# Altium footprint library Intelliclone.PcbLib: 372 footprints (part 15 of 24)
Each footprint in its own frame and in the unit in brackets; x right, y up, seen from the top. Pads: shape width x height; smd on the part's side, far side on the other; paste and mask are expansions set on the pad; w line width, h text height; cw(c..) or ccw(c..) is an arc to the next point about the centre after c.
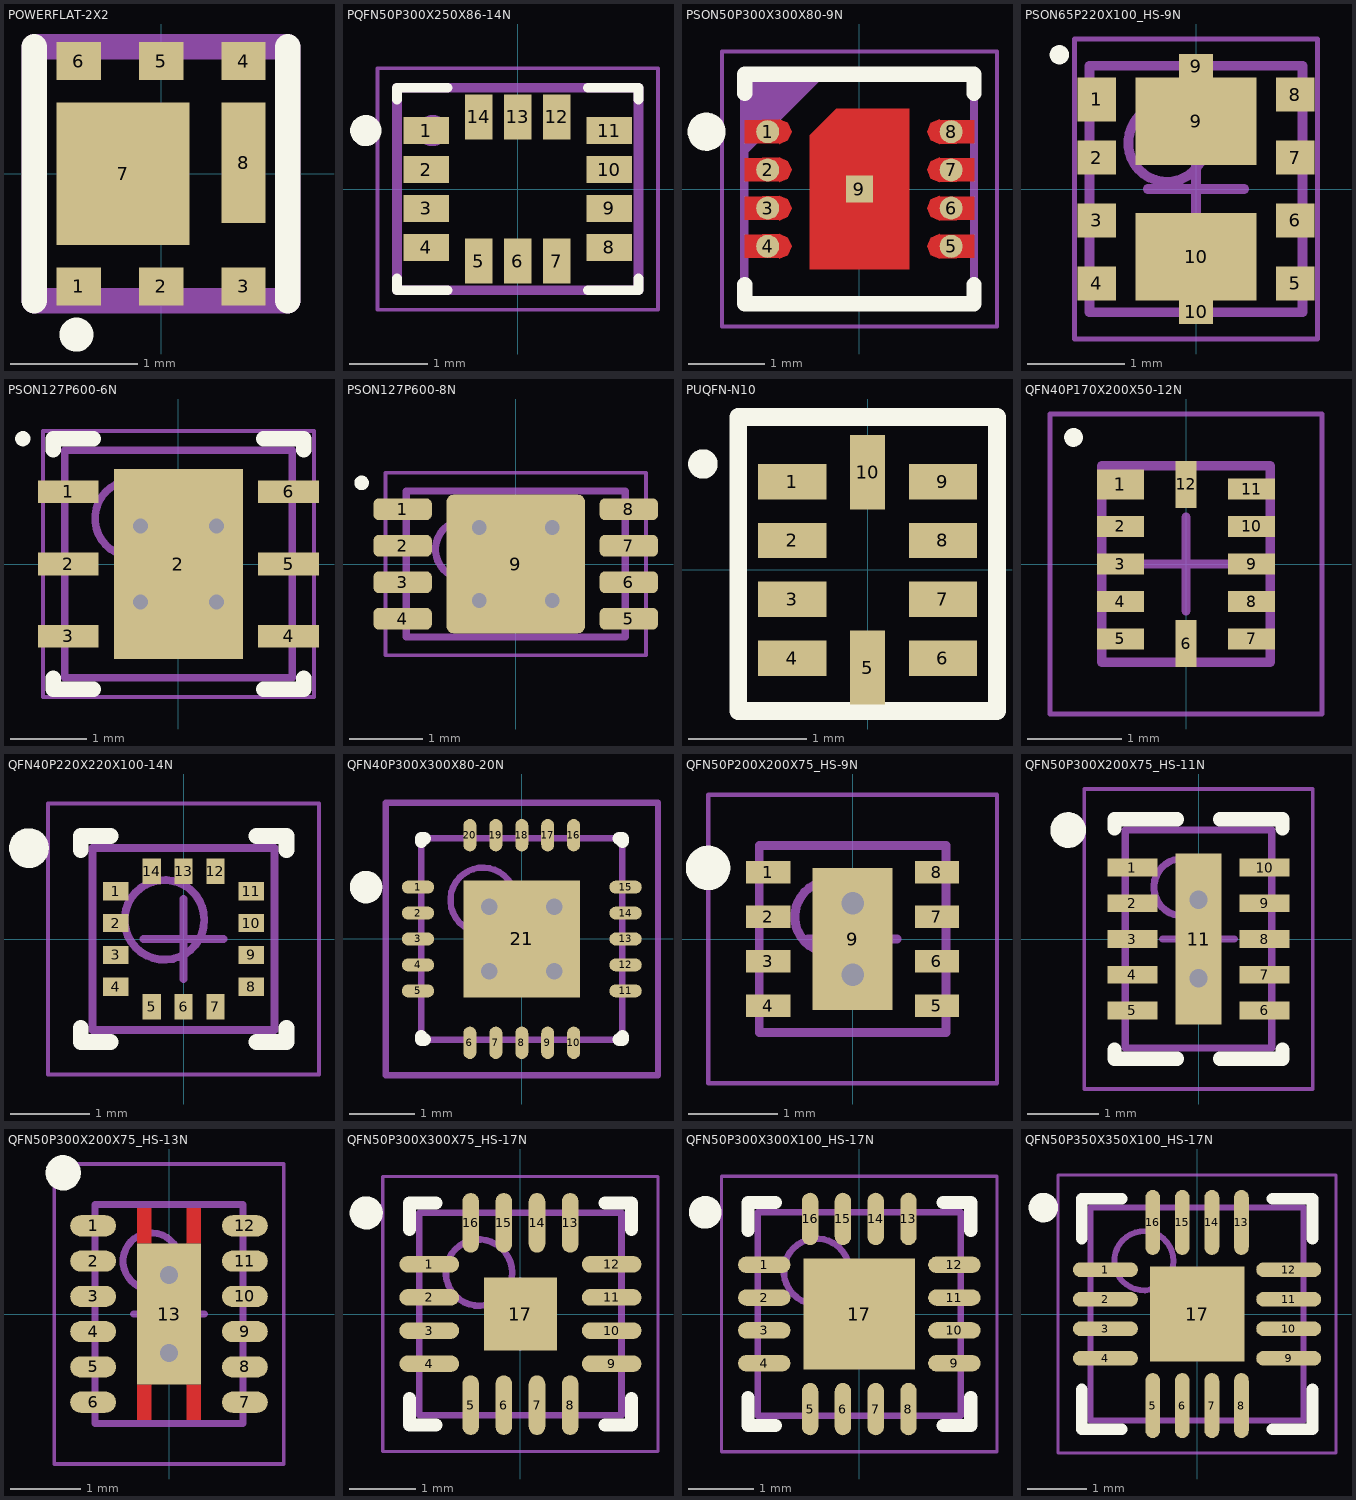
[diagram p14: the footprints below, top view; thin cyan lines are the x and y axes]

## POWERFLAT-2X2 [mm]
pads (8):
  rect 0.35x0.3 smd: 1(-0.65,-0.887) 2(0,-0.887) 3(0.65,-0.887) 4(0.65,0.887) 5(0,0.887) 6(-0.65,0.887)
  rect 1.05x1.125 smd: 7(-0.3,0)
  rect 0.35x0.95 smd: 8(0.65,0.088)
Top Overlay:
  circle w0.2: c-0.667,-1.268 r0.034
  lines w0.2: -1,-1 -1,1 ; 1,-1 1,1
Mechanical 15:
  lines w0.2: -1,-1 -1,1 1,1 1,-1 -1,-1
3D body: height 0.8, standoff 0, extent -0.825,-1.035 0.825,1.035

## PQFN50P300X250X86-14N [mm]
pads (14):
  rect 0.58x0.35 smd: 1(-1.175,0.75) 2(-1.175,0.25) 3(-1.175,-0.25) 4(-1.175,-0.75) 8(1.175,-0.75) 9(1.175,-0.25) 10(1.175,0.25) 11(1.175,0.75)
  rect 0.35x0.58 smd: 5(-0.5,-0.925) 6(0,-0.925) 7(0.5,-0.925) 12(0.5,0.925) 13(0,0.925) 14(-0.5,0.925)
Top Overlay:
  circle w0.2: c-1.95,0.75 r0.1
  lines w0.127: -1.55,-1.15 -1.55,-1.3 -0.9,-1.3 ; -1.55,1.15 -1.55,1.3 -0.9,1.3 ; 0.9,-1.3 1.55,-1.3 1.55,-1.15 ; 0.9,1.3 1.55,1.3 1.55,1.15
Mechanical 4:
  circle w0.2: c-1.095,0.75 r0.1
  circle w0.2: c-1.095,0.75 r0.1
  lines w0.127: -1.55,-1.3 -1.55,1.3 ; -1.55,-1.3 1.55,-1.3 ; -1.55,-1.3 1.55,-1.3 ; -1.55,-1.3 -1.55,1.3 ; -1.55,1.3 1.55,1.3 ; -1.55,1.3 1.55,1.3 ; 1.55,-1.3 1.55,1.3 ; 1.55,-1.3 1.55,1.3
Mechanical 15:
  lines w0.05: -1.8,-1.55 1.8,-1.55 1.8,1.55 -1.8,1.55 -1.8,-1.55
3D body "LSM6DS3TR--3DModel-STEP-56544.STEP": height 0.86, standoff 0, extent -1.5,-1.25 1.5,1.25

## PSON50P300X300X80-9N [mm]
height 0.8
pads (9):
  round 0.3 smd: 1(-1.2,0.75) 2(-1.2,0.25) 3(-1.2,-0.25) 4(-1.2,-0.75) 5(1.2,-0.75) 6(1.2,-0.25) 7(1.2,0.25) 8(1.2,0.75)
  rect 0.35x0.35 smd: 9(0,0)
Top Layer:
  region: -1.5,0.9 -1.05,0.912 -0.935,0.865 -0.888,0.75 -0.935,0.635 -1.05,0.588 -1.05,0.6 -1.5,0.6
  region: -1.5,0.4 -1.05,0.412 -0.935,0.365 -0.888,0.25 -0.935,0.135 -1.05,0.088 -1.05,0.1 -1.5,0.1
  region: -1.5,-0.1 -1.05,-0.088 -0.935,-0.135 -0.888,-0.25 -0.935,-0.365 -1.05,-0.412 -1.05,-0.4 -1.5,-0.4
  region: -1.5,-0.6 -1.05,-0.588 -0.935,-0.635 -0.888,-0.75 -0.935,-0.865 -1.05,-0.912 -1.05,-0.9 -1.5,-0.9
  region: 1.5,-0.9 1.05,-0.912 0.935,-0.865 0.888,-0.75 0.935,-0.635 1.05,-0.588 1.05,-0.6 1.5,-0.6
  region: 1.5,-0.4 1.05,-0.412 0.935,-0.365 0.888,-0.25 0.935,-0.135 1.05,-0.088 1.05,-0.1 1.5,-0.1
  region: 1.5,0.1 1.05,0.088 0.935,0.135 0.888,0.25 0.935,0.365 1.05,0.412 1.05,0.4 1.5,0.4
  region: 1.5,0.6 1.05,0.588 0.935,0.635 0.888,0.75 0.935,0.865 1.05,0.912 1.05,0.9 1.5,0.9
  region: -0.65,0.7 -0.3,1.05 0.65,1.05 0.65,-1.05 -0.65,-1.05
Top Overlay:
  circle w0.25: c-2,0.75 r0.125
  lines w0.2: -1.5,-1.25 -1.5,-1.5 1.5,-1.5 1.5,-1.25 ; -1.5,1.25 -1.5,1.5 1.5,1.5 1.5,1.25
Top Paste:
  region: -1.5,0.9 -1.05,0.912 -0.935,0.865 -0.888,0.75 -0.935,0.635 -1.05,0.588 -1.05,0.6 -1.5,0.6
  region: -1.5,0.4 -1.05,0.412 -0.935,0.365 -0.888,0.25 -0.935,0.135 -1.05,0.088 -1.05,0.1 -1.5,0.1
  region: -1.5,-0.1 -1.05,-0.088 -0.935,-0.135 -0.888,-0.25 -0.935,-0.365 -1.05,-0.412 -1.05,-0.4 -1.5,-0.4
  region: -1.5,-0.6 -1.05,-0.588 -0.935,-0.635 -0.888,-0.75 -0.935,-0.865 -1.05,-0.912 -1.05,-0.9 -1.5,-0.9
  region: 1.5,-0.9 1.05,-0.912 0.935,-0.865 0.888,-0.75 0.935,-0.635 1.05,-0.588 1.05,-0.6 1.5,-0.6
  region: 1.5,-0.4 1.05,-0.412 0.935,-0.365 0.888,-0.25 0.935,-0.135 1.05,-0.088 1.05,-0.1 1.5,-0.1
  region: 1.5,0.1 1.05,0.088 0.935,0.135 0.888,0.25 0.935,0.365 1.05,0.412 1.05,0.4 1.5,0.4
  region: 1.5,0.6 1.05,0.588 0.935,0.635 0.888,0.75 0.935,0.865 1.05,0.912 1.05,0.9 1.5,0.9
  region: -0.359,0.759 0.36,0.759 0.36,-0.76 -0.359,-0.76
Top Solder:
  region: -1.5,0.9 -1.05,0.912 -0.935,0.865 -0.888,0.75 -0.935,0.635 -1.05,0.588 -1.05,0.6 -1.5,0.6
  region: -1.5,0.4 -1.05,0.412 -0.935,0.365 -0.888,0.25 -0.935,0.135 -1.05,0.088 -1.05,0.1 -1.5,0.1
  region: -1.5,-0.1 -1.05,-0.088 -0.935,-0.135 -0.888,-0.25 -0.935,-0.365 -1.05,-0.412 -1.05,-0.4 -1.5,-0.4
  region: -1.5,-0.6 -1.05,-0.588 -0.935,-0.635 -0.888,-0.75 -0.935,-0.865 -1.05,-0.912 -1.05,-0.9 -1.5,-0.9
  region: 1.5,-0.9 1.05,-0.912 0.935,-0.865 0.888,-0.75 0.935,-0.635 1.05,-0.588 1.05,-0.6 1.5,-0.6
  region: 1.5,-0.4 1.05,-0.412 0.935,-0.365 0.888,-0.25 0.935,-0.135 1.05,-0.088 1.05,-0.1 1.5,-0.1
  region: 1.5,0.1 1.05,0.088 0.935,0.135 0.888,0.25 0.935,0.365 1.05,0.412 1.05,0.4 1.5,0.4
  region: 1.5,0.6 1.05,0.588 0.935,0.635 0.888,0.75 0.935,0.865 1.05,0.912 1.05,0.9 1.5,0.9
  region: -0.65,0.7 -0.3,1.05 0.65,1.05 0.65,-1.05 -0.65,-1.05
Mechanical 15:
  lines w0.1: -1.5,0.5 -0.5,1.5 ; -1.5,0.6 -0.6,1.5 ; -1.5,0.7 -0.7,1.5 ; -1.5,0.8 -0.8,1.5 ; -1.5,0.9 -0.9,1.5 ; -1.5,1 -1,1.5 ; -1.5,1.1 -1.1,1.5 ; -1.5,1.2 -1.2,1.5 ; -1.5,1.3 -1.3,1.5 ; -1.5,1.4 -1.4,1.5 ; -1.5,-1.5 -1.5,1.5 1.5,1.5 1.5,-1.5 -1.5,-1.5
Mechanical 20:
  circle w0.05: c0,0 r0.35
  lines w0.05: -0.5,0 0.5,0 ; 0,-0.5 0,0.5 ; -1.8,-1.8 -1.8,1.8 1.8,1.8 1.8,-1.8 -1.8,-1.8
Mechanical 21:
  lines w0.001: -1.55,-1.55 -1.55,1.55 1.55,1.55 1.55,-1.55 -1.55,-1.55
3D body: height 0.03, standoff 0, extent -1.4,-1.4 1.4,1.4

## PSON65P220X100_HS-9N [mm] "PSON, 8-Leads, Body 2.50x2.15mm, Pitch 0.65mm, Thermal Pad 2.30x1.05mm, IPC Medium Density"
height 1
pads (12):
  rect 0.4x0.45 smd: 1(-1.025,0.925)
  rect 0.4x0.35 smd: 2(-1.025,0.325) 3(-1.025,-0.325) 4(-1.025,-0.975) 5(1.025,-0.975) 6(1.025,-0.325) 7(1.025,0.325) 8(1.025,0.975)
  rect 1.25x0.9 smd paste-0.1: 9(0,0.7) 10(0,-0.7)
  rect 0.35x0.25 smd: 9(0,1.27) 10(0,-1.27)
Top Overlay:
  circle w0.1: c-1.412,1.387 r0.05
Mechanical 13:
  circle w0.1: c-0.3,0.475 r0.4
  lines w0.1: -1.1,-1.275 -1.1,1.275 1.1,1.275 1.1,-1.275 -1.1,-1.275
Mechanical 15:
  lines w0.05: -1.255,-1.55 -1.255,1.55 1.255,1.55 1.255,-1.55 -1.255,-1.55
  lines w0.1: -0.5,0 0.5,0 ; 0,-0.5 0,0.5
3D body: height 1, standoff 0, extent -1.1,-1.275 1.1,1.275

## PSON127P600-6N [mm] "DFN6 (3x3 mm)"
height 0.9
pads (7):
  rect 0.8x0.3 smd: 1(-1.45,0.95) 2(-1.45,0) 3(-1.45,-0.95) 4(1.45,-0.95) 5(1.45,0) 6(1.45,0.95)
  rect 1.7x2.5 smd: 2(0,0)
via 0.5,-0.5 diameter 0.5 hole 0.2
via -0.5,-0.5 diameter 0.5 hole 0.2
via 0.5,0.5 diameter 0.5 hole 0.2
via -0.5,0.5 diameter 0.5 hole 0.2
Top Overlay:
  circle w0.1: c-2.05,1.65 r0.05
  lines w0.2: -1.65,-1.5 -1.65,-1.65 -1.12,-1.65 ; -1.65,1.5 -1.65,1.65 -1.12,1.65 ; 1.12,-1.65 1.65,-1.65 1.65,-1.5 ; 1.12,1.65 1.65,1.65 1.65,1.5
Mechanical 13:
  circle w0.1: c-0.6,0.6 r0.5
  lines w0.1: -1.5,-1.5 1.5,-1.5 1.5,1.5 -1.5,1.5 -1.5,-1.5
Mechanical 15:
  lines w0.05: -1.785,-1.75 1.785,-1.75 1.785,1.75 -1.785,1.75 -1.785,-1.75
  lines w0.1: -0.5,0 0.5,0 ; 0,-0.5 0,0.5
3D body "PSON127P600-8N.step": height 0.9, standoff 0, extent -1.501,-1.5 1.501,1.5

## PSON127P600-8N [mm] "DFN8 (2x3 mm)"
height 0.9
pads (9):
  rrect50% 0.8x0.3 smd: 1(-1.55,0.75) 2(-1.55,0.25) 3(-1.55,-0.25) 4(-1.55,-0.75) 5(1.55,-0.75) 6(1.55,-0.25) 7(1.55,0.25) 8(1.55,0.75)
  rrect10% 1.9x1.9 smd: 9(0,0)
via 0.5,-0.5 diameter 0.5 hole 0.2
via -0.5,-0.5 diameter 0.5 hole 0.2
via 0.5,0.5 diameter 0.5 hole 0.2
via -0.5,0.5 diameter 0.5 hole 0.2
Top Overlay:
  circle w0.1: c-2.112,1.112 r0.05
Mechanical 13:
  circle w0.1: c-0.7,0.2 r0.4
  lines w0.1: -1.5,-1 1.5,-1 1.5,1 -1.5,1 -1.5,-1
Mechanical 15:
  lines w0.05: -1.785,-1.25 1.785,-1.25 1.785,1.25 -1.785,1.25 -1.785,-1.25
  lines w0.1: -0.5,0 0.5,0 ; 0,-0.5 0,0.5
3D body "PSON127P600-8N.step": height 0.9, standoff 0, extent -1.501,-1 1.501,1

## PUQFN-N10 [mm]
pads (10):
  rect 0.58x0.3 smd: 1(-0.64,0.75) 2(-0.64,0.25) 3(-0.64,-0.25) 4(-0.64,-0.75) 6(0.64,-0.75) 7(0.64,-0.25) 8(0.64,0.25) 9(0.64,0.75)
  rect 0.3x0.63 smd: 5(0,-0.83) 10(0,0.83)
Top Overlay:
  circle w0.15: c-1.4,0.9 r0.05
  lines w0.15: -1.1,-1.2 1.1,-1.2 1.1,1.3 0.175,1.3 -1.1,1.3 -1.1,-1.2

## QFN40P170X200X50-12N [mm] "QFN, 12-Leads, Body 1.70x2.00mm, Pitch 0.40mm, IPC Medium Density"
height 0.5
pads (12):
  rect 0.5x0.32 smd: 1(-0.7,0.85)
  rect 0.5x0.22 smd: 2(-0.7,0.4) 3(-0.7,0) 4(-0.7,-0.4) 5(-0.7,-0.8) 7(0.7,-0.8) 8(0.7,-0.4) 9(0.7,0) 10(0.7,0.4) 11(0.7,0.8)
  rect 0.22x0.5 smd: 6(0,-0.85) 12(0,0.85)
Top Overlay:
  circle w0.1: c-1.2,1.35 r0.05
Mechanical 13:
  lines w0.1: -0.9,-1.05 -0.9,1.05 0.9,1.05 0.9,-1.05 -0.9,-1.05
Mechanical 15:
  lines w0.05: -1.45,-1.6 -1.45,1.6 1.45,1.6 1.45,-1.6 -1.45,-1.6
  lines w0.1: -0.5,0 0.5,0 ; 0,-0.5 0,0.5
3D body "QFN40P170X200X50-12N.step": height 0.5, standoff 0, extent -0.95,-1.1 0.95,1.1

## QFN40P220X220X100-14N [mm] "QFN, 14-Leads, Body 2.20x2.20mm, Pitch 0.40mm, IPC Medium Density"
height 1
pads (14):
  rect 0.32x0.23 smd: 1(-0.853,0.6) 2(-0.853,0.2) 3(-0.853,-0.2) 4(-0.853,-0.6) 8(0.853,-0.6) 9(0.853,-0.2) 10(0.853,0.2) 11(0.853,0.6)
  rect 0.23x0.32 smd: 5(-0.4,-0.853) 6(0,-0.853) 7(0.4,-0.853) 12(0.4,0.853) 13(0,0.853) 14(-0.4,0.853)
Top Overlay:
  circle w0.25: c-1.94,1.14 r0.125
  lines w0.2: -1.29,-1.115 -1.29,-1.29 -0.915,-1.29 ; -1.29,1.115 -1.29,1.29 -0.915,1.29 ; 0.915,-1.29 1.29,-1.29 1.29,-1.115 ; 0.915,1.29 1.29,1.29 1.29,1.115
Mechanical 13:
  circle w0.1: c-0.24,0.24 r0.5
  lines w0.1: -1.14,-1.14 -1.14,1.14 1.14,1.14 1.14,-1.14 -1.14,-1.14
Mechanical 15:
  lines w0.05: -1.7,-1.7 -1.7,1.7 1.7,1.7 1.7,-1.7 -1.7,-1.7
  lines w0.1: -0.5,0 0.5,0 ; 0,-0.5 0,0.5
3D body "QFN40P220X220X100-14N.step": height 1, standoff 0, extent -1.27,-1.27 1.27,1.27

## QFN40P300X300X80-20N [mm] "QFN, 20-Leads, Body 3.1x3.1mm (max), Pitch 0.40mm, IPC Medium Density"
height 0.8
pads (21):
  oval 0.5x0.2 smd: 1(-1.6,0.8) 2(-1.6,0.4) 3(-1.6,0) 4(-1.6,-0.4) 5(-1.6,-0.8) 11(1.6,-0.8) 12(1.6,-0.4) 13(1.6,0) 14(1.6,0.4) 15(1.6,0.8)
  oval 0.2x0.5 smd: 6(-0.8,-1.6) 7(-0.4,-1.6) 8(0,-1.6) 9(0.4,-1.6) 10(0.8,-1.6) 16(0.8,1.6) 17(0.4,1.6) 18(0,1.6) 19(-0.4,1.6) 20(-0.8,1.6)
  rect 1.8x1.8 smd: 21(0,0)
via -0.5,0.5 diameter 0.559 hole 0.254
via -0.5,-0.5 diameter 0.559 hole 0.254
via 0.5,-0.5 diameter 0.559 hole 0.254
via 0.5,0.5 diameter 0.559 hole 0.254
Top Overlay:
  circle w0.25: c-2.4,0.8 r0.125
  lines w0.2: -1.55,-1.5 -1.55,-1.55 -1.5,-1.55 ; -1.55,1.5 -1.55,1.55 -1.5,1.55 ; 1.5,-1.55 1.55,-1.55 1.55,-1.5 ; 1.5,1.55 1.55,1.55 1.55,1.5
Mechanical 13:
  circle w0.1: c-0.6,0.6 r0.5
  lines w0.1: -1.55,-1.55 1.55,-1.55 1.55,1.55 -1.55,1.55 -1.55,-1.55
Mechanical 15:
  lines w0.1: -0.5,0 0.5,0 ; 0,-0.5 0,0.5 ; -2.1,-2.1 2.1,-2.1 2.1,2.1 -2.1,2.1 -2.1,-2.1
3D body: height 0.8, standoff 0.01, extent -1.55,-1.55 1.55,1.55

## QFN50P200X200X75_HS-9N [mm] "QFN, 8-Leads, Body 2.00x2.00mm, Pitch 0.50mm, Thermal Pad 1.60x0.90mm, IPC Medium Density"
height 0.75
pads (9):
  rect 0.5x0.25 smd: 1(-0.95,0.75) 2(-0.95,0.25) 3(-0.95,-0.25) 4(-0.95,-0.75) 5(0.95,-0.75) 6(0.95,-0.25) 7(0.95,0.25) 8(0.95,0.75)
  rect 0.9x1.6 smd: 9(0,0)
via 0,0.4 diameter 0.559 hole 0.254
via 0,-0.4 diameter 0.559 hole 0.254
Top Overlay:
  circle w0.25: c-1.625,0.8 r0.125
Mechanical 13:
  circle w0.1: c-0.25,0.25 r0.4
  lines w0.1: -1.05,-1.05 -1.05,1.05 1.05,1.05 1.05,-1.05 -1.05,-1.05
Mechanical 15:
  lines w0.05: -1.625,-1.625 -1.625,1.625 1.625,1.625 1.625,-1.625 -1.625,-1.625
  lines w0.1: -0.5,0 0.5,0 ; 0,-0.5 0,0.5
3D body: height 0.75, standoff 0.05, extent -1.05,-1.05 1.05,1.05

## QFN50P300X200X75_HS-11N [mm] "QFN, 10-Leads, Body 3.00x2.00mm, Pitch 0.50mm, Thermal Pad 2.40x1.15mm, IPC Medium Density"
height 0.75
pads (11):
  rect 0.7x0.25 smd: 1(-0.925,1) 2(-0.925,0.5) 3(-0.925,0) 4(-0.925,-0.5) 5(-0.925,-1) 6(0.925,-1) 7(0.925,-0.5) 8(0.925,0) 9(0.925,0.5) 10(0.925,1)
  rect 0.64x2.4 smd: 11(0,0)
via 0,0.55 diameter 0.559 hole 0.254
via 0,-0.55 diameter 0.559 hole 0.254
Top Overlay:
  circle w0.25: c-1.825,1.525 r0.125
  lines w0.2: -1.175,-1.55 -1.175,-1.675 -0.3,-1.675 ; -1.175,1.55 -1.175,1.675 -0.3,1.675 ; 0.3,-1.675 1.175,-1.675 1.175,-1.55 ; 0.3,1.675 1.175,1.675 1.175,1.55
Mechanical 13:
  circle w0.1: c-0.225,0.725 r0.4
  lines w0.1: -1.025,-1.525 -1.025,1.525 1.025,1.525 1.025,-1.525 -1.025,-1.525
Mechanical 15:
  lines w0.05: -1.6,-2.1 -1.6,2.1 1.6,2.1 1.6,-2.1 -1.6,-2.1
  lines w0.1: -0.5,0 0.5,0 ; 0,-0.5 0,0.5
3D body: height 0.75, standoff 0.05, extent -1.025,-1.525 1.025,1.525

## QFN50P300X200X75_HS-13N [mm] "QFN, 12-Leads, Body 3.00x2.00mm, Pitch 0.50mm, Thermal Pad 2.00x0.90mm, IPC Medium Density"
height 0.75
pads (13):
  oval 0.65x0.3 smd: 1(-1.075,1.25) 2(-1.075,0.75) 3(-1.075,0.25) 4(-1.075,-0.25) 5(-1.075,-0.75) 6(-1.075,-1.25) 7(1.075,-1.25) 8(1.075,-0.75) 9(1.075,-0.25) 10(1.075,0.25) 11(1.075,0.75) 12(1.075,1.25)
  rect 0.9x2 smd: 13(0,0)
via 0,-0.55 diameter 0.559 hole 0.254
via 0,0.55 diameter 0.559 hole 0.254
Top Layer:
  rectangle: -0.45,-1.5 -0.25,-1
  rectangle: 0.25,-1.5 0.45,-1
  rectangle: 0.25,1 0.45,1.5
  rectangle: -0.45,1 -0.25,1.5
Top Overlay:
  circle w0.25: c-1.5,2 r0.125
Mechanical 13:
  circle w0.1: c-0.25,0.75 r0.4
  lines w0.1: -1.05,-1.55 1.05,-1.55 1.05,1.55 -1.05,1.55 -1.05,-1.55
Mechanical 15:
  lines w0.05: -1.625,-2.125 1.625,-2.125 1.625,2.125 -1.625,2.125 -1.625,-2.125
  lines w0.1: -0.5,0 0.5,0 ; 0,-0.5 0,0.5
3D body: height 0.75, standoff 0.05, extent -1.05,-1.55 1.05,1.55

## QFN50P300X300X75_HS-17N [mm] "QFN, 16-Leads, Body 3.00x3.00mm, Pitch 0.50mm, Thermal Pad 1.10x1.10mm, IPC Medium Density"
height 0.75
pads (17):
  oval 0.9x0.25 smd: 1(-1.375,0.75) 2(-1.375,0.25) 3(-1.375,-0.25) 4(-1.375,-0.75) 9(1.375,-0.75) 10(1.375,-0.25) 11(1.375,0.25) 12(1.375,0.75)
  oval 0.25x0.9 smd: 5(-0.75,-1.375) 6(-0.25,-1.375) 7(0.25,-1.375) 8(0.75,-1.375) 13(0.75,1.375) 14(0.25,1.375) 15(-0.25,1.375) 16(-0.75,1.375)
  rect 1.1x1.1 smd: 17(0,0)
Top Overlay:
  circle w0.25: c-2.325,1.525 r0.125
  lines w0.2: -1.675,-1.275 -1.675,-1.675 -1.275,-1.675 ; -1.675,1.275 -1.675,1.675 -1.275,1.675 ; 1.275,-1.675 1.675,-1.675 1.675,-1.275 ; 1.275,1.675 1.675,1.675 1.675,1.275
Mechanical 13:
  circle w0.1: c-0.625,0.625 r0.5
  lines w0.1: -1.525,-1.525 1.525,-1.525 1.525,1.525 -1.525,1.525 -1.525,-1.525
Mechanical 15:
  lines w0.05: -2.075,-2.075 2.075,-2.075 2.075,2.075 -2.075,2.075 -2.075,-2.075
  lines w0.1: -0.5,0 0.5,0 ; 0,-0.5 0,0.5
3D body: height 0.75, standoff 0.08, extent -1.525,-1.525 1.525,1.525

## QFN50P300X300X100_HS-17N [mm] "QFN, 16-Leads, Body 3.00x3.00mm, Pitch 0.50mm, Thermal Pad 1.70x1.70mm, IPC Medium Density"
height 1
pads (17):
  oval 0.8x0.25 smd: 1(-1.45,0.75) 2(-1.45,0.25) 3(-1.45,-0.25) 4(-1.45,-0.75) 9(1.45,-0.75) 10(1.45,-0.25) 11(1.45,0.25) 12(1.45,0.75)
  oval 0.25x0.8 smd: 5(-0.75,-1.45) 6(-0.25,-1.45) 7(0.25,-1.45) 8(0.75,-1.45) 13(0.75,1.45) 14(0.25,1.45) 15(-0.25,1.45) 16(-0.75,1.45)
  rect 1.7x1.7 smd: 17(0,0)
Top Overlay:
  circle w0.25: c-2.35,1.55 r0.125
  lines w0.2: -1.7,-1.275 -1.7,-1.7 -1.275,-1.7 ; -1.7,1.275 -1.7,1.7 -1.275,1.7 ; 1.275,-1.7 1.7,-1.7 1.7,-1.275 ; 1.275,1.7 1.7,1.7 1.7,1.275
Mechanical 13:
  circle w0.1: c-0.65,0.65 r0.5
  lines w0.1: -1.55,-1.55 -1.55,1.55 1.55,1.55 1.55,-1.55 -1.55,-1.55
Mechanical 15:
  lines w0.05: -2.1,-2.1 -2.1,2.1 2.1,2.1 2.1,-2.1 -2.1,-2.1
  lines w0.1: -0.5,0 0.5,0 ; 0,-0.5 0,0.5
3D body: height 1, standoff 0.08, extent -1.55,-1.55 1.55,1.55

## QFN50P350X350X100_HS-17N [mm] "QFN, 16-Leads, Body 3.50x3.50mm, Pitch 0.50mm, Thermal Pad 1.60x1.60mm, IPC Medium Density"
height 1
pads (17):
  oval 1.1x0.25 smd: 1(-1.55,0.75) 2(-1.55,0.25) 3(-1.55,-0.25) 4(-1.55,-0.75) 9(1.55,-0.75) 10(1.55,-0.25) 11(1.55,0.25) 12(1.55,0.75)
  oval 0.25x1.1 smd: 5(-0.75,-1.55) 6(-0.25,-1.55) 7(0.25,-1.55) 8(0.75,-1.55) 13(0.75,1.55) 14(0.25,1.55) 15(-0.25,1.55) 16(-0.75,1.55)
  rect 1.6x1.6 smd: 17(0,0)
Top Overlay:
  circle w0.25: c-2.6,1.8 r0.125
  lines w0.2: -1.95,-1.275 -1.95,-1.95 -1.275,-1.95 ; -1.95,1.275 -1.95,1.95 -1.275,1.95 ; 1.275,-1.95 1.95,-1.95 1.95,-1.275 ; 1.275,1.95 1.95,1.95 1.95,1.275
Mechanical 13:
  circle w0.1: c-0.9,0.9 r0.5
  lines w0.1: -1.8,-1.8 1.8,-1.8 1.8,1.8 -1.8,1.8 -1.8,-1.8
Mechanical 15:
  lines w0.05: -2.35,-2.35 2.35,-2.35 2.35,2.35 -2.35,2.35 -2.35,-2.35
  lines w0.1: -0.5,0 0.5,0 ; 0,-0.5 0,0.5
3D body "QFN50P350X350X100_HS-17N.step": height 1, standoff 0, extent -1.88,-1.88 1.88,1.88